# Altium footprint library Embedded_Modules.PcbLib: 15 footprints
Each footprint in its own frame and in the unit in brackets; x right, y up, seen from the top. Pads: shape width x height; smd on the part's side, far side on the other; paste and mask are expansions set on the pad; w line width, h text height; cw(c..) or ccw(c..) is an arc to the next point about the centre after c.
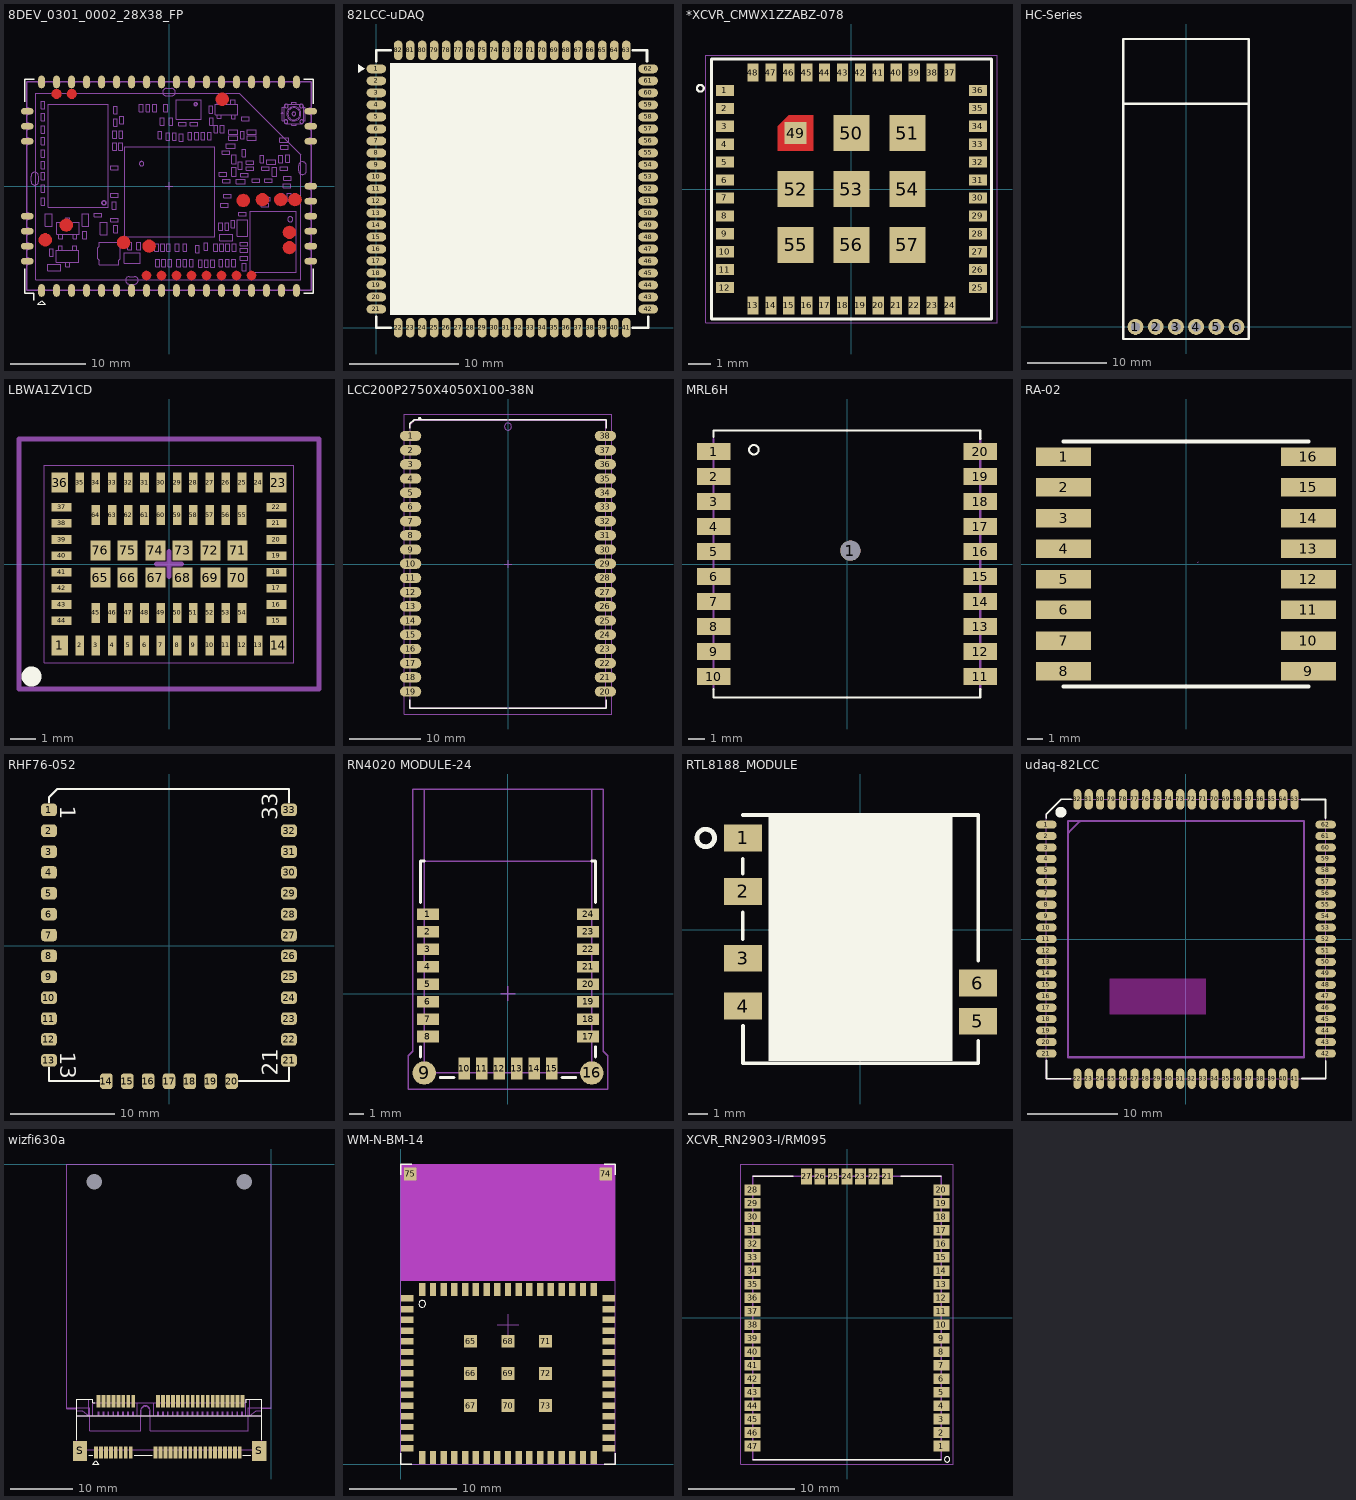
[diagram p0: the footprints below, top view; thin cyan lines are the x and y axes]

## 8DEV_0301_0002_28X38_FP [mm]
height 1.2
pads (52):
  oval 0.898x1.698 smd mask+0.1: 1(-16.998,-13.898) 2(-14.998,-13.898) 3(-12.998,-13.898) 4(-10.999,-13.898) 5(-8.998,-13.898) 6(-6.998,-13.898) 7(-4.998,-13.898) 8(-2.998,-13.898) 9(-0.998,-13.898) 10(0.998,-13.898) 11(2.998,-13.898) 12(4.998,-13.898) 13(6.998,-13.898) 14(8.998,-13.898) 15(10.998,-13.898) 16(12.998,-13.898) 17(14.998,-13.898) 18(16.998,-13.898) 28(16.998,13.898) 29(14.998,13.898) 30(12.998,13.898) 31(10.998,13.898) 32(8.998,13.898) 33(6.998,13.898) 34(4.998,13.898) 35(2.998,13.898) 36(0.998,13.898) 37(-0.998,13.898) 38(-2.998,13.898) 39(-4.998,13.898) 40(-6.998,13.898) 41(-8.998,13.898) 42(-10.999,13.898) 43(-12.998,13.898) 44(-14.998,13.898) 45(-16.998,13.898)
  oval 1.698x0.898 smd mask+0.1: 19(18.898,-9.998) 20(18.898,-7.998) 21(18.898,-5.998) 22(18.898,-3.998) 23(18.898,-1.998) 24(18.898,0) 25(18.898,5.998) 26(18.898,7.998) 27(18.898,9.998) 46(-18.898,9.998) 47(-18.898,7.998) 48(-18.898,5.998) 49(-18.898,-3.998) 50(-18.898,-5.998) 51(-18.898,-7.998) 52(-18.898,-9.998)
Top Layer:
  pour cut-out: 16.273,-7.357 16.274,-7.358 16.276,-7.358 16.483,-7.444 16.484,-7.445 16.486,-7.446 16.663,-7.582 16.664,-7.584 16.666,-7.585 16.802,-7.762 16.803,-7.764 16.804,-7.765 16.89,-7.972 16.89,-7.974 16.891,-7.975 16.92,-8.197 16.919,-8.199 16.92,-8.201 16.891,-8.423 16.89,-8.424 16.89,-8.426 16.804,-8.633 16.803,-8.634 16.802,-8.636 16.666,-8.813 16.664,-8.814 16.663,-8.816 16.486,-8.952 16.484,-8.953 16.483,-8.954 16.276,-9.04 16.274,-9.04 16.273,-9.041 16.051,-9.07 16.049,-9.069 16.047,-9.07 15.825,-9.041 15.824,-9.04 15.822,-9.04 15.615,-8.954 15.614,-8.953 15.612,-8.952 15.435,-8.816 15.434,-8.814 15.432,-8.813 15.296,-8.636 15.295,-8.634 15.294,-8.633 15.208,-8.426 15.208,-8.424 15.207,-8.423 15.178,-8.201 15.178,-8.2 15.178,-8.199 15.18,-8.195 15.181,-8.191 15.182,-8.19 15.182,-8.189 15.182,-8.188 15.18,-8.184 15.18,-8.183 15.18,-8.182 15.207,-7.975 15.208,-7.974 15.208,-7.972 15.294,-7.765 15.295,-7.764 15.296,-7.762 15.432,-7.585 15.434,-7.584 15.435,-7.582 15.612,-7.446 15.614,-7.445 15.615,-7.444 15.822,-7.358 15.824,-7.358 15.825,-7.357 16.047,-7.328 16.049,-7.329 16.051,-7.328
  pour cut-out: -13.475,-4.357 -13.474,-4.358 -13.472,-4.358 -13.265,-4.444 -13.264,-4.445 -13.262,-4.446 -13.085,-4.582 -13.084,-4.584 -13.082,-4.585 -12.946,-4.762 -12.945,-4.764 -12.944,-4.765 -12.858,-4.972 -12.858,-4.974 -12.857,-4.975 -12.828,-5.197 -12.829,-5.199 -12.828,-5.201 -12.857,-5.423 -12.858,-5.424 -12.858,-5.426 -12.944,-5.633 -12.945,-5.634 -12.946,-5.636 -13.082,-5.813 -13.084,-5.814 -13.085,-5.816 -13.262,-5.952 -13.264,-5.953 -13.265,-5.954 -13.472,-6.04 -13.474,-6.04 -13.475,-6.041 -13.697,-6.07 -13.699,-6.069 -13.701,-6.07 -13.923,-6.041 -13.924,-6.04 -13.926,-6.04 -14.133,-5.954 -14.134,-5.953 -14.136,-5.952 -14.313,-5.816 -14.314,-5.814 -14.316,-5.813 -14.452,-5.636 -14.453,-5.634 -14.454,-5.633 -14.54,-5.426 -14.54,-5.424 -14.541,-5.423 -14.57,-5.201 -14.57,-5.2 -14.57,-5.199 -14.568,-5.195 -14.567,-5.191 -14.566,-5.19 -14.566,-5.189 -14.566,-5.188 -14.568,-5.184 -14.568,-5.183 -14.568,-5.182 -14.541,-4.975 -14.54,-4.974 -14.54,-4.972 -14.454,-4.765 -14.453,-4.764 -14.452,-4.762 -14.316,-4.585 -14.314,-4.584 -14.313,-4.582 -14.136,-4.446 -14.134,-4.445 -14.133,-4.444 -13.926,-4.358 -13.924,-4.358 -13.923,-4.357 -13.701,-4.328 -13.699,-4.329 -13.697,-4.328
  pour cut-out: -5.825,-6.657 -5.824,-6.658 -5.822,-6.658 -5.615,-6.744 -5.614,-6.745 -5.612,-6.746 -5.435,-6.882 -5.434,-6.884 -5.432,-6.885 -5.296,-7.062 -5.295,-7.064 -5.294,-7.065 -5.208,-7.272 -5.208,-7.274 -5.207,-7.275 -5.178,-7.497 -5.179,-7.499 -5.178,-7.501 -5.207,-7.723 -5.208,-7.724 -5.208,-7.726 -5.294,-7.933 -5.295,-7.934 -5.296,-7.936 -5.432,-8.113 -5.434,-8.114 -5.435,-8.116 -5.612,-8.252 -5.614,-8.253 -5.615,-8.254 -5.822,-8.34 -5.824,-8.34 -5.825,-8.341 -6.047,-8.37 -6.049,-8.369 -6.051,-8.37 -6.273,-8.341 -6.274,-8.34 -6.276,-8.34 -6.483,-8.254 -6.484,-8.253 -6.486,-8.252 -6.663,-8.116 -6.664,-8.114 -6.666,-8.113 -6.802,-7.936 -6.803,-7.934 -6.804,-7.933 -6.89,-7.726 -6.89,-7.724 -6.891,-7.723 -6.92,-7.501 -6.92,-7.5 -6.92,-7.499 -6.918,-7.495 -6.917,-7.491 -6.916,-7.49 -6.916,-7.489 -6.916,-7.488 -6.918,-7.484 -6.918,-7.483 -6.918,-7.482 -6.891,-7.275 -6.89,-7.274 -6.89,-7.272 -6.804,-7.065 -6.803,-7.064 -6.802,-7.062 -6.666,-6.885 -6.664,-6.884 -6.663,-6.882 -6.486,-6.746 -6.484,-6.745 -6.483,-6.744 -6.276,-6.658 -6.274,-6.658 -6.273,-6.657 -6.051,-6.628 -6.049,-6.629 -6.047,-6.628
  pour cut-out: -2.425,-7.157 -2.424,-7.158 -2.422,-7.158 -2.215,-7.244 -2.214,-7.245 -2.212,-7.246 -2.035,-7.382 -2.034,-7.384 -2.032,-7.385 -1.896,-7.562 -1.895,-7.564 -1.894,-7.565 -1.808,-7.772 -1.808,-7.774 -1.807,-7.775 -1.778,-7.997 -1.779,-7.999 -1.778,-8.001 -1.807,-8.223 -1.808,-8.224 -1.808,-8.226 -1.894,-8.433 -1.895,-8.434 -1.896,-8.436 -2.032,-8.613 -2.034,-8.614 -2.035,-8.616 -2.212,-8.752 -2.214,-8.753 -2.215,-8.754 -2.422,-8.84 -2.424,-8.84 -2.425,-8.841 -2.647,-8.87 -2.649,-8.869 -2.651,-8.87 -2.873,-8.841 -2.874,-8.84 -2.876,-8.84 -3.083,-8.754 -3.084,-8.753 -3.086,-8.752 -3.263,-8.616 -3.264,-8.614 -3.266,-8.613 -3.402,-8.436 -3.403,-8.434 -3.404,-8.433 -3.49,-8.226 -3.49,-8.224 -3.491,-8.223 -3.52,-8.001 -3.52,-8 -3.52,-7.999 -3.518,-7.995 -3.517,-7.991 -3.516,-7.99 -3.516,-7.989 -3.516,-7.988 -3.518,-7.984 -3.518,-7.983 -3.518,-7.982 -3.491,-7.775 -3.49,-7.774 -3.49,-7.772 -3.404,-7.565 -3.403,-7.564 -3.402,-7.562 -3.266,-7.385 -3.264,-7.384 -3.263,-7.382 -3.086,-7.246 -3.084,-7.245 -3.083,-7.244 -2.876,-7.158 -2.874,-7.158 -2.873,-7.157 -2.651,-7.128 -2.649,-7.129 -2.647,-7.128
  pour cut-out: -2.759,-11.313 -2.757,-11.314 -2.754,-11.315 -2.553,-11.449 -2.551,-11.451 -2.549,-11.453 -2.415,-11.654 -2.414,-11.657 -2.413,-11.659 -2.366,-11.896 -2.366,-11.899 -2.366,-11.902 -2.413,-12.139 -2.414,-12.141 -2.415,-12.144 -2.549,-12.345 -2.551,-12.347 -2.553,-12.349 -2.754,-12.483 -2.757,-12.484 -2.759,-12.485 -2.996,-12.532 -2.999,-12.532 -3.002,-12.532 -3.239,-12.485 -3.241,-12.484 -3.244,-12.483 -3.445,-12.349 -3.447,-12.347 -3.449,-12.345 -3.583,-12.144 -3.584,-12.141 -3.585,-12.139 -3.632,-11.902 -3.632,-11.899 -3.632,-11.896 -3.585,-11.659 -3.584,-11.657 -3.583,-11.654 -3.449,-11.453 -3.447,-11.451 -3.445,-11.449 -3.244,-11.315 -3.241,-11.314 -3.239,-11.313 -3.102,-11.285 -3.101,-11.285 -3.101,-11.286 -3.093,-11.284 -3.091,-11.283 -3.002,-11.266 -2.999,-11.266 -2.996,-11.266
  pour cut-out: 7.323,12.441 7.324,12.44 7.326,12.44 7.533,12.354 7.534,12.353 7.536,12.352 7.713,12.216 7.714,12.214 7.716,12.213 7.852,12.036 7.853,12.034 7.854,12.033 7.94,11.826 7.94,11.824 7.941,11.823 7.97,11.601 7.969,11.599 7.97,11.597 7.941,11.375 7.94,11.374 7.94,11.372 7.854,11.165 7.853,11.164 7.852,11.162 7.716,10.985 7.714,10.984 7.713,10.982 7.536,10.846 7.534,10.845 7.533,10.844 7.326,10.758 7.324,10.758 7.323,10.757 7.101,10.728 7.099,10.729 7.097,10.728 6.875,10.757 6.874,10.758 6.872,10.758 6.665,10.844 6.664,10.845 6.662,10.846 6.485,10.982 6.484,10.984 6.482,10.985 6.346,11.162 6.345,11.164 6.344,11.165 6.258,11.372 6.258,11.374 6.257,11.375 6.228,11.597 6.228,11.598 6.228,11.599 6.23,11.603 6.231,11.607 6.232,11.608 6.232,11.609 6.232,11.61 6.23,11.614 6.23,11.615 6.23,11.616 6.257,11.823 6.258,11.824 6.258,11.826 6.344,12.033 6.345,12.034 6.346,12.036 6.482,12.213 6.484,12.214 6.485,12.216 6.662,12.352 6.664,12.353 6.665,12.354 6.872,12.44 6.874,12.44 6.875,12.441 7.097,12.47 7.099,12.469 7.101,12.47
  pour cut-out: -0.759,-11.313 -0.757,-11.314 -0.754,-11.315 -0.553,-11.449 -0.551,-11.451 -0.549,-11.453 -0.415,-11.654 -0.414,-11.657 -0.413,-11.659 -0.366,-11.896 -0.366,-11.899 -0.366,-11.902 -0.413,-12.139 -0.414,-12.141 -0.415,-12.144 -0.549,-12.345 -0.551,-12.347 -0.553,-12.349 -0.754,-12.483 -0.757,-12.484 -0.759,-12.485 -0.996,-12.532 -0.999,-12.532 -1.002,-12.532 -1.239,-12.485 -1.241,-12.484 -1.244,-12.483 -1.445,-12.349 -1.447,-12.347 -1.449,-12.345 -1.583,-12.144 -1.584,-12.141 -1.585,-12.139 -1.632,-11.902 -1.632,-11.899 -1.632,-11.896 -1.585,-11.659 -1.584,-11.657 -1.583,-11.654 -1.449,-11.453 -1.447,-11.451 -1.445,-11.449 -1.244,-11.315 -1.241,-11.314 -1.239,-11.313 -1.102,-11.285 -1.101,-11.285 -1.101,-11.286 -1.093,-11.284 -1.091,-11.283 -1.002,-11.266 -0.999,-11.266 -0.996,-11.266
  pour cut-out: 1.239,-11.313 1.241,-11.314 1.244,-11.315 1.445,-11.449 1.447,-11.451 1.449,-11.453 1.583,-11.654 1.584,-11.657 1.585,-11.659 1.632,-11.896 1.632,-11.899 1.632,-11.902 1.585,-12.139 1.584,-12.141 1.583,-12.144 1.449,-12.345 1.447,-12.347 1.445,-12.349 1.244,-12.483 1.241,-12.484 1.239,-12.485 1.002,-12.532 0.999,-12.532 0.996,-12.532 0.759,-12.485 0.757,-12.484 0.754,-12.483 0.553,-12.349 0.551,-12.347 0.549,-12.345 0.415,-12.144 0.414,-12.141 0.413,-12.139 0.366,-11.902 0.366,-11.899 0.366,-11.896 0.413,-11.659 0.414,-11.657 0.415,-11.654 0.549,-11.453 0.551,-11.451 0.553,-11.449 0.754,-11.315 0.757,-11.314 0.759,-11.313 0.896,-11.285 0.897,-11.285 0.897,-11.286 0.905,-11.284 0.907,-11.283 0.996,-11.266 0.999,-11.266 1.002,-11.266
  pour cut-out: 3.239,-11.313 3.241,-11.314 3.244,-11.315 3.445,-11.449 3.447,-11.451 3.449,-11.453 3.583,-11.654 3.584,-11.657 3.585,-11.659 3.632,-11.896 3.632,-11.899 3.632,-11.902 3.585,-12.139 3.584,-12.141 3.583,-12.144 3.449,-12.345 3.447,-12.347 3.445,-12.349 3.244,-12.483 3.241,-12.484 3.239,-12.485 3.002,-12.532 2.999,-12.532 2.996,-12.532 2.759,-12.485 2.757,-12.484 2.754,-12.483 2.553,-12.349 2.551,-12.347 2.549,-12.345 2.415,-12.144 2.414,-12.141 2.413,-12.139 2.366,-11.902 2.366,-11.899 2.366,-11.896 2.413,-11.659 2.414,-11.657 2.415,-11.654 2.549,-11.453 2.551,-11.451 2.553,-11.449 2.754,-11.315 2.757,-11.314 2.759,-11.313 2.896,-11.285 2.897,-11.285 2.897,-11.286 2.905,-11.284 2.907,-11.283 2.996,-11.266 2.999,-11.266 3.002,-11.266
  pour cut-out: -12.7,12.909 -12.698,12.908 -12.695,12.907 -12.486,12.768 -12.484,12.766 -12.482,12.764 -12.343,12.555 -12.342,12.552 -12.341,12.55 -12.292,12.304 -12.292,12.301 -12.292,12.298 -12.341,12.052 -12.342,12.05 -12.343,12.047 -12.482,11.838 -12.484,11.836 -12.486,11.834 -12.695,11.695 -12.698,11.694 -12.7,11.693 -12.946,11.644 -12.949,11.644 -12.952,11.644 -13.198,11.693 -13.2,11.694 -13.203,11.695 -13.412,11.834 -13.414,11.836 -13.416,11.838 -13.555,12.047 -13.556,12.05 -13.557,12.052 -13.606,12.298 -13.606,12.301 -13.606,12.304 -13.557,12.55 -13.556,12.552 -13.555,12.555 -13.416,12.764 -13.414,12.766 -13.412,12.768 -13.203,12.907 -13.2,12.908 -13.198,12.909 -13.154,12.918 -13.15,12.917 -13.148,12.917 -13.145,12.92 -13.144,12.92 -13.143,12.92 -12.952,12.958 -12.949,12.958 -12.946,12.958
  pour cut-out: -14.75,12.909 -14.748,12.908 -14.745,12.907 -14.536,12.768 -14.534,12.766 -14.532,12.764 -14.393,12.555 -14.392,12.552 -14.391,12.55 -14.342,12.304 -14.342,12.301 -14.342,12.298 -14.391,12.052 -14.392,12.05 -14.393,12.047 -14.532,11.838 -14.534,11.836 -14.536,11.834 -14.745,11.695 -14.748,11.694 -14.75,11.693 -14.996,11.644 -14.999,11.644 -15.002,11.644 -15.248,11.693 -15.25,11.694 -15.253,11.695 -15.462,11.834 -15.464,11.836 -15.466,11.838 -15.605,12.047 -15.606,12.05 -15.607,12.052 -15.656,12.298 -15.656,12.301 -15.656,12.304 -15.607,12.55 -15.606,12.552 -15.605,12.555 -15.466,12.764 -15.464,12.766 -15.462,12.768 -15.253,12.907 -15.25,12.908 -15.248,12.909 -15.204,12.918 -15.2,12.917 -15.198,12.917 -15.195,12.92 -15.194,12.92 -15.193,12.92 -15.002,12.958 -14.999,12.958 -14.996,12.958
  pour cut-out: -16.275,-6.307 -16.274,-6.308 -16.272,-6.308 -16.065,-6.394 -16.064,-6.395 -16.062,-6.396 -15.885,-6.532 -15.884,-6.534 -15.882,-6.535 -15.746,-6.712 -15.745,-6.714 -15.744,-6.715 -15.658,-6.922 -15.658,-6.924 -15.657,-6.925 -15.628,-7.147 -15.629,-7.149 -15.628,-7.151 -15.657,-7.373 -15.658,-7.374 -15.658,-7.376 -15.744,-7.583 -15.745,-7.584 -15.746,-7.586 -15.882,-7.763 -15.884,-7.764 -15.885,-7.766 -16.062,-7.902 -16.064,-7.903 -16.065,-7.904 -16.272,-7.99 -16.274,-7.99 -16.275,-7.991 -16.497,-8.02 -16.499,-8.019 -16.501,-8.02 -16.723,-7.991 -16.724,-7.99 -16.726,-7.99 -16.933,-7.904 -16.934,-7.903 -16.936,-7.902 -17.113,-7.766 -17.114,-7.764 -17.116,-7.763 -17.252,-7.586 -17.253,-7.584 -17.254,-7.583 -17.34,-7.376 -17.34,-7.374 -17.341,-7.373 -17.37,-7.151 -17.37,-7.15 -17.37,-7.149 -17.368,-7.145 -17.367,-7.141 -17.366,-7.14 -17.366,-7.139 -17.366,-7.138 -17.368,-7.134 -17.368,-7.133 -17.368,-7.132 -17.341,-6.925 -17.34,-6.924 -17.34,-6.922 -17.254,-6.715 -17.253,-6.714 -17.252,-6.712 -17.116,-6.535 -17.114,-6.534 -17.113,-6.532 -16.936,-6.396 -16.934,-6.395 -16.933,-6.394 -16.726,-6.308 -16.724,-6.308 -16.723,-6.307 -16.501,-6.278 -16.499,-6.279 -16.497,-6.278
  pour cut-out: 5.239,-11.313 5.241,-11.314 5.244,-11.315 5.445,-11.449 5.447,-11.451 5.449,-11.453 5.583,-11.654 5.584,-11.657 5.585,-11.659 5.632,-11.896 5.632,-11.899 5.632,-11.902 5.585,-12.139 5.584,-12.141 5.583,-12.144 5.449,-12.345 5.447,-12.347 5.445,-12.349 5.244,-12.483 5.241,-12.484 5.239,-12.485 5.002,-12.532 4.999,-12.532 4.996,-12.532 4.759,-12.485 4.757,-12.484 4.754,-12.483 4.553,-12.349 4.551,-12.347 4.549,-12.345 4.415,-12.144 4.414,-12.141 4.413,-12.139 4.366,-11.902 4.366,-11.899 4.366,-11.896 4.413,-11.659 4.414,-11.657 4.415,-11.654 4.549,-11.453 4.551,-11.451 4.553,-11.449 4.754,-11.315 4.757,-11.314 4.759,-11.313 4.896,-11.285 4.897,-11.285 4.897,-11.286 4.905,-11.284 4.907,-11.283 4.996,-11.266 4.999,-11.266 5.002,-11.266
  pour cut-out: 7.239,-11.313 7.241,-11.314 7.244,-11.315 7.445,-11.449 7.447,-11.451 7.449,-11.453 7.583,-11.654 7.584,-11.657 7.585,-11.659 7.632,-11.896 7.632,-11.899 7.632,-11.902 7.585,-12.139 7.584,-12.141 7.583,-12.144 7.449,-12.345 7.447,-12.347 7.445,-12.349 7.244,-12.483 7.241,-12.484 7.239,-12.485 7.002,-12.532 6.999,-12.532 6.996,-12.532 6.759,-12.485 6.757,-12.484 6.754,-12.483 6.553,-12.349 6.551,-12.347 6.549,-12.345 6.415,-12.144 6.414,-12.141 6.413,-12.139 6.366,-11.902 6.366,-11.899 6.366,-11.896 6.413,-11.659 6.414,-11.657 6.415,-11.654 6.549,-11.453 6.551,-11.451 6.553,-11.449 6.754,-11.315 6.757,-11.314 6.759,-11.313 6.896,-11.285 6.897,-11.285 6.897,-11.286 6.905,-11.284 6.907,-11.283 6.996,-11.266 6.999,-11.266 7.002,-11.266
  pour cut-out: 9.239,-11.313 9.241,-11.314 9.244,-11.315 9.445,-11.449 9.447,-11.451 9.449,-11.453 9.583,-11.654 9.584,-11.657 9.585,-11.659 9.632,-11.896 9.632,-11.899 9.632,-11.902 9.585,-12.139 9.584,-12.141 9.583,-12.144 9.449,-12.345 9.447,-12.347 9.445,-12.349 9.244,-12.483 9.241,-12.484 9.239,-12.485 9.002,-12.532 8.999,-12.532 8.996,-12.532 8.759,-12.485 8.757,-12.484 8.754,-12.483 8.553,-12.349 8.551,-12.347 8.549,-12.345 8.415,-12.144 8.414,-12.141 8.413,-12.139 8.366,-11.902 8.366,-11.899 8.366,-11.896 8.413,-11.659 8.414,-11.657 8.415,-11.654 8.549,-11.453 8.551,-11.451 8.553,-11.449 8.754,-11.315 8.757,-11.314 8.759,-11.313 8.896,-11.285 8.897,-11.285 8.897,-11.286 8.905,-11.284 8.907,-11.283 8.996,-11.266 8.999,-11.266 9.002,-11.266
  pour cut-out: 11.239,-11.313 11.241,-11.314 11.244,-11.315 11.445,-11.449 11.447,-11.451 11.449,-11.453 11.583,-11.654 11.584,-11.657 11.585,-11.659 11.632,-11.896 11.632,-11.899 11.632,-11.902 11.585,-12.139 11.584,-12.141 11.583,-12.144 11.449,-12.345 11.447,-12.347 11.445,-12.349 11.244,-12.483 11.241,-12.484 11.239,-12.485 11.002,-12.532 10.999,-12.532 10.996,-12.532 10.759,-12.485 10.757,-12.484 10.754,-12.483 10.553,-12.349 10.551,-12.347 10.549,-12.345 10.415,-12.144 10.414,-12.141 10.413,-12.139 10.366,-11.902 10.366,-11.899 10.366,-11.896 10.413,-11.659 10.414,-11.657 10.415,-11.654 10.549,-11.453 10.551,-11.451 10.553,-11.449 10.754,-11.315 10.757,-11.314 10.759,-11.313 10.896,-11.285 10.897,-11.285 10.897,-11.286 10.905,-11.284 10.907,-11.283 10.996,-11.266 10.999,-11.266 11.002,-11.266
  pour cut-out: 10.123,-1.057 10.124,-1.058 10.126,-1.058 10.333,-1.144 10.334,-1.145 10.336,-1.146 10.513,-1.282 10.514,-1.284 10.516,-1.285 10.652,-1.462 10.653,-1.464 10.654,-1.465 10.74,-1.672 10.74,-1.674 10.741,-1.675 10.77,-1.897 10.769,-1.899 10.77,-1.901 10.741,-2.123 10.74,-2.124 10.74,-2.126 10.654,-2.333 10.653,-2.334 10.652,-2.336 10.516,-2.513 10.514,-2.514 10.513,-2.516 10.336,-2.652 10.334,-2.653 10.333,-2.654 10.126,-2.74 10.124,-2.74 10.123,-2.741 9.901,-2.77 9.899,-2.769 9.897,-2.77 9.675,-2.741 9.674,-2.74 9.672,-2.74 9.465,-2.654 9.464,-2.653 9.462,-2.652 9.285,-2.516 9.284,-2.514 9.282,-2.513 9.146,-2.336 9.145,-2.334 9.144,-2.333 9.058,-2.126 9.058,-2.124 9.057,-2.123 9.028,-1.901 9.028,-1.9 9.028,-1.899 9.03,-1.895 9.031,-1.891 9.032,-1.89 9.032,-1.889 9.032,-1.888 9.03,-1.884 9.03,-1.883 9.03,-1.882 9.057,-1.675 9.058,-1.674 9.058,-1.672 9.144,-1.465 9.145,-1.464 9.146,-1.462 9.282,-1.285 9.284,-1.284 9.285,-1.282 9.462,-1.146 9.464,-1.145 9.465,-1.144 9.672,-1.058 9.674,-1.058 9.675,-1.057 9.897,-1.028 9.899,-1.029 9.901,-1.028
  pour cut-out: 12.673,-0.957 12.674,-0.958 12.676,-0.958 12.883,-1.044 12.884,-1.045 12.886,-1.046 13.063,-1.182 13.064,-1.184 13.066,-1.185 13.202,-1.362 13.203,-1.364 13.204,-1.365 13.29,-1.572 13.29,-1.574 13.291,-1.575 13.32,-1.797 13.319,-1.799 13.32,-1.801 13.291,-2.023 13.29,-2.024 13.29,-2.026 13.204,-2.233 13.203,-2.234 13.202,-2.236 13.066,-2.413 13.064,-2.414 13.063,-2.416 12.886,-2.552 12.884,-2.553 12.883,-2.554 12.676,-2.64 12.674,-2.64 12.673,-2.641 12.451,-2.67 12.449,-2.669 12.447,-2.67 12.225,-2.641 12.224,-2.64 12.222,-2.64 12.015,-2.554 12.014,-2.553 12.012,-2.552 11.835,-2.416 11.834,-2.414 11.832,-2.413 11.696,-2.236 11.695,-2.234 11.694,-2.233 11.608,-2.026 11.608,-2.024 11.607,-2.023 11.578,-1.801 11.578,-1.8 11.578,-1.799 11.58,-1.795 11.581,-1.791 11.582,-1.79 11.582,-1.789 11.582,-1.788 11.58,-1.784 11.58,-1.783 11.58,-1.782 11.607,-1.575 11.608,-1.574 11.608,-1.572 11.694,-1.365 11.695,-1.364 11.696,-1.362 11.832,-1.185 11.834,-1.184 11.835,-1.182 12.012,-1.046 12.014,-1.045 12.015,-1.044 12.222,-0.958 12.224,-0.958 12.225,-0.957 12.447,-0.928 12.449,-0.929 12.451,-0.928
  pour cut-out: 15.123,-0.957 15.124,-0.958 15.126,-0.958 15.333,-1.044 15.334,-1.045 15.336,-1.046 15.513,-1.182 15.514,-1.184 15.516,-1.185 15.652,-1.362 15.653,-1.364 15.654,-1.365 15.74,-1.572 15.74,-1.574 15.741,-1.575 15.77,-1.797 15.769,-1.799 15.77,-1.801 15.741,-2.023 15.74,-2.024 15.74,-2.026 15.654,-2.233 15.653,-2.234 15.652,-2.236 15.516,-2.413 15.514,-2.414 15.513,-2.416 15.336,-2.552 15.334,-2.553 15.333,-2.554 15.126,-2.64 15.124,-2.64 15.123,-2.641 14.901,-2.67 14.899,-2.669 14.897,-2.67 14.675,-2.641 14.674,-2.64 14.672,-2.64 14.465,-2.554 14.464,-2.553 14.462,-2.552 14.285,-2.416 14.284,-2.414 14.282,-2.413 14.146,-2.236 14.145,-2.234 14.144,-2.233 14.058,-2.026 14.058,-2.024 14.057,-2.023 14.028,-1.801 14.028,-1.8 14.028,-1.799 14.03,-1.795 14.031,-1.791 14.032,-1.79 14.032,-1.789 14.032,-1.788 14.03,-1.784 14.03,-1.783 14.03,-1.782 14.057,-1.575 14.058,-1.574 14.058,-1.572 14.144,-1.365 14.145,-1.364 14.146,-1.362 14.282,-1.185 14.284,-1.184 14.285,-1.182 14.462,-1.046 14.464,-1.045 14.465,-1.044 14.672,-0.958 14.674,-0.958 14.675,-0.957 14.897,-0.928 14.899,-0.929 14.901,-0.928
  pour cut-out: 17.023,-0.957 17.024,-0.958 17.026,-0.958 17.233,-1.044 17.234,-1.045 17.236,-1.046 17.413,-1.182 17.414,-1.184 17.416,-1.185 17.552,-1.362 17.553,-1.364 17.554,-1.365 17.64,-1.572 17.64,-1.574 17.641,-1.575 17.67,-1.797 17.669,-1.799 17.67,-1.801 17.641,-2.023 17.64,-2.024 17.64,-2.026 17.554,-2.233 17.553,-2.234 17.552,-2.236 17.416,-2.413 17.414,-2.414 17.413,-2.416 17.236,-2.552 17.234,-2.553 17.233,-2.554 17.026,-2.64 17.024,-2.64 17.023,-2.641 16.801,-2.67 16.799,-2.669 16.797,-2.67 16.575,-2.641 16.574,-2.64 16.572,-2.64 16.365,-2.554 16.364,-2.553 16.362,-2.552 16.185,-2.416 16.184,-2.414 16.182,-2.413 16.046,-2.236 16.045,-2.234 16.044,-2.233 15.958,-2.026 15.958,-2.024 15.957,-2.023 15.928,-1.801 15.928,-1.8 15.928,-1.799 15.93,-1.795 15.931,-1.791 15.932,-1.79 15.932,-1.789 15.932,-1.788 15.93,-1.784 15.93,-1.783 15.93,-1.782 15.957,-1.575 15.958,-1.574 15.958,-1.572 16.044,-1.365 16.045,-1.364 16.046,-1.362 16.182,-1.185 16.184,-1.184 16.185,-1.182 16.362,-1.046 16.364,-1.045 16.365,-1.044 16.572,-0.958 16.574,-0.958 16.575,-0.957 16.797,-0.928 16.799,-0.929 16.801,-0.928
  pour cut-out: 16.273,-5.308 16.274,-5.309 16.276,-5.309 16.483,-5.395 16.484,-5.396 16.486,-5.397 16.663,-5.533 16.664,-5.535 16.666,-5.536 16.802,-5.713 16.803,-5.715 16.804,-5.716 16.89,-5.923 16.89,-5.925 16.891,-5.926 16.92,-6.148 16.919,-6.15 16.92,-6.152 16.891,-6.374 16.89,-6.375 16.89,-6.377 16.804,-6.584 16.803,-6.585 16.802,-6.587 16.666,-6.764 16.664,-6.765 16.663,-6.767 16.486,-6.903 16.484,-6.904 16.483,-6.905 16.276,-6.991 16.274,-6.991 16.273,-6.992 16.051,-7.021 16.049,-7.02 16.047,-7.021 15.825,-6.992 15.824,-6.991 15.822,-6.991 15.615,-6.905 15.614,-6.904 15.612,-6.903 15.435,-6.767 15.434,-6.765 15.432,-6.764 15.296,-6.587 15.295,-6.585 15.294,-6.584 15.208,-6.377 15.208,-6.375 15.207,-6.374 15.178,-6.152 15.178,-6.151 15.178,-6.15 15.18,-6.146 15.181,-6.142 15.182,-6.141 15.182,-6.14 15.182,-6.139 15.18,-6.135 15.18,-6.134 15.18,-6.133 15.207,-5.926 15.208,-5.925 15.208,-5.923 15.294,-5.716 15.295,-5.715 15.296,-5.713 15.432,-5.536 15.434,-5.535 15.435,-5.533 15.612,-5.397 15.614,-5.396 15.615,-5.395 15.822,-5.309 15.824,-5.309 15.825,-5.308 16.047,-5.279 16.049,-5.28 16.051,-5.279
Top Overlay:
  lines w0.15: -17.5,-15.75 -17,-15.25 -16.5,-15.75 -17.5,-15.75
  lines w0.199: -19.249,-10.999 -19.249,-14.25 -18.049,-14.25 -18.049,-15.199 ; -19.249,11.249 -19.249,14.249 -17.999,14.249 ; 17.949,14.249 19.249,14.249 19.249,10.999 ; 17.999,-14.25 19.249,-14.25 19.249,-10.999
Top Paste:
  drawing of 52 lines, arcs and shapes, not listed
Mechanical 1:
  drawing of 827 lines, arcs and shapes, not listed
  text "46" at -18.734,10.591 h0.52
  text "27" at 17.938,10.491 h0.52
  text "45" at -18.484,12.841 h0.52
  text "19" at 17.617,-11.461 h0.52
  text "1" at -18.119,-13.591 h0.52
  text "18" at 17.478,-13.496 h0.52
  text "28" at 17.118,12.306 h0.52
  text ".Pattern" at -6.971,-15.68 h0.37
  text "52" at -18.684,-11.356 h0.52
Mechanical 16:
  lines w0.025: -0.498,0 0.498,0 ; 0,-0.498 0,0.498
3D body: height 1, standoff 0, extent -18.949,-13.899 18.949,13.899
3D body: height 2, standoff 1, extent -17.799,-12.499 17.599,12.399
3D body: height 1.5, standoff 1, extent 15.35,8.35 17.948,10.948

## 82LCC-uDAQ [mm] "82-LCC - 24.7x25.3mm"
pads (82):
  oval 1.8x0.8 smd: 1(0,23.7) 2(0,22.6) 3(0,21.5) 4(0,20.4) 5(0,19.3) 6(0,18.2) 7(0,17.1) 8(0,16) 9(0,14.9) 10(0,13.8) 11(0,12.7) 12(0,11.6) 13(0,10.5) 14(0,9.4) 15(0,8.3) 16(0,7.2) 17(0,6.1) 18(0,5) 19(0,3.9) 20(0,2.8) 21(0,1.7) 42(24.9,1.7) 43(24.9,2.8) 44(24.9,3.9) 45(24.9,5) 46(24.9,6.1) 47(24.9,7.2) 48(24.9,8.3) 49(24.9,9.4) 50(24.9,10.5) 51(24.9,11.6) 52(24.9,12.7) 53(24.9,13.8) 54(24.9,14.9) 55(24.9,16) 56(24.9,17.1) 57(24.9,18.2) 58(24.9,19.3) 59(24.9,20.4) 60(24.9,21.5) 61(24.9,22.6) 62(24.9,23.7)
  oval 0.8x1.8 smd: 22(2,0) 23(3.1,0) 24(4.2,0) 25(5.3,0) 26(6.4,0) 27(7.5,0) 28(8.6,0) 29(9.7,0) 30(10.8,0) 31(11.9,0) 32(13,0) 33(14.1,0) 34(15.2,0) 35(16.3,0) 36(17.4,0) 37(18.5,0) 38(19.6,0) 39(20.7,0) 40(21.8,0) 41(22.9,0) 63(22.9,25.4) 64(21.8,25.4) 65(20.7,25.4) 66(19.6,25.4) 67(18.5,25.4) 68(17.4,25.4) 69(16.3,25.4) 70(15.2,25.4) 71(14.1,25.4) 72(13,25.4) 73(11.9,25.4) 74(10.8,25.4) 75(9.7,25.4) 76(8.6,25.4) 77(7.5,25.4) 78(6.4,25.4) 79(5.3,25.4) 80(4.2,25.4) 81(3.1,25.4) 82(2,25.4)
Top Overlay:
  rectangle: 1.25,1.15 23.775,24.225
  region: -1.075,23.725 -1.675,24.125 -1.675,23.325
  lines w0.254: 0,1 0,0 1.3,0 ; 0,24.4 0,25.4 1.3,25.4 ; 23.5,0 24.9,0 24.9,1 ; 23.5,25.4 24.8,25.4 24.8,24.4
3D body "uDAQ.step": height 2.92, standoff 0.01, extent -0.05,-0.05 24.852,25.35

## *XCVR_CMWX1ZZABZ-078 [mm]
pads (57):
  rect 0.8x0.5 smd: 1(-5.65,4.4) 2(-5.65,3.6) 3(-5.65,2.8) 4(-5.65,2) 5(-5.65,1.2) 6(-5.65,0.4) 7(-5.65,-0.4) 8(-5.65,-1.2) 9(-5.65,-2) 10(-5.65,-2.8) 11(-5.65,-3.6) 12(-5.65,-4.4) 25(5.65,-4.4) 26(5.65,-3.6) 27(5.65,-2.8) 28(5.65,-2) 29(5.65,-1.2) 30(5.65,-0.4) 31(5.65,0.4) 32(5.65,1.2) 33(5.65,2) 34(5.65,2.8) 35(5.65,3.6) 36(5.65,4.4)
  rect 0.5x0.8 smd: 13(-4.4,-5.2) 14(-3.6,-5.2) 15(-2.8,-5.2) 16(-2,-5.2) 17(-1.2,-5.2) 18(-0.4,-5.2) 19(0.4,-5.2) 20(1.2,-5.2) 21(2,-5.2) 22(2.8,-5.2) 23(3.6,-5.2) 24(4.4,-5.2) 37(4.4,5.2) 38(3.6,5.2) 39(2.8,5.2) 40(2,5.2) 41(1.2,5.2) 42(0.4,5.2) 43(-0.4,5.2) 44(-1.2,5.2) 45(-2,5.2) 46(-2.8,5.2) 47(-3.6,5.2) 48(-4.4,5.2)
  rect 1x1 smd: 49(-2.5,2.5)
  rect 1.6x1.6 smd: 50(0,2.5) 51(2.5,2.5) 52(-2.5,0) 53(0,0) 54(2.5,0) 55(-2.5,-2.5) 56(0,-2.5) 57(2.5,-2.5)
Top Layer:
  region: -1.225,1.65 -0.975,1.65 0.975,1.65 1.225,1.65
  region: -1.7,1.7 -1.7,3.3 -2.8,3.3 -3.3,2.8 -3.3,1.7
Top Overlay:
  circle w0.1: c-6.75,4.5 r0.15
  lines w0.127: -6.25,-5.8 -6.25,5.8 6.25,5.8 6.25,-5.8 -6.25,-5.8
Top Paste:
  region: -1.7,1.7 -1.7,3.3 -2.8,3.3 -3.3,2.8 -3.3,1.7
Top Solder:
  region: -1.225,1.65 -0.975,1.65 0.975,1.65 1.225,1.65
  region: -3.4,1.6 -1.6,1.6 -1.6,3.4 -2.9,3.4 -3.4,2.9
Mechanical 16:
  lines w0.05: -6.5,-5.975 6.5,-5.975 6.5,5.975 -6.5,5.975 -6.5,-5.975
3D body "CMWX1ZZABZ-078--3DModel-STEP-56544.STEP": height 1.76, standoff 0, extent -6.25,-5.8 6.25,5.8

## HC-Series [mm]
pads (6):
  round 2 hole 1.1: 1(-6.35,0) 2(-3.81,0) 3(-1.27,0) 4(1.27,0) 5(3.81,0) 6(6.35,0)
Top Overlay:
  lines w0.3: -7.874,28.067 7.874,28.067 ; -7.874,-1.524 -7.874,36.195 7.874,36.195 7.874,-1.524 -7.874,-1.524
3D body "HC-SERIES.stp": height 3.91, standoff -7.52, extent -7.977,-1.397 7.723,36.203

## LBWA1ZV1CD [mm]
pads (76):
  rect 0.65x0.8 smd: 1(-4.375,-3.25) 14(4.375,-3.25) 23(4.375,3.25) 36(-4.375,3.25)
  rect 0.35x0.8 smd: 2(-3.575,-3.25) 3(-2.925,-3.25) 4(-2.275,-3.25) 5(-1.625,-3.25) 6(-0.975,-3.25) 7(-0.325,-3.25) 8(0.325,-3.25) 9(0.975,-3.25) 10(1.625,-3.25) 11(2.275,-3.25) 12(2.925,-3.25) 13(3.575,-3.25) 24(3.575,3.25) 25(2.925,3.25) 26(2.275,3.25) 27(1.625,3.25) 28(0.975,3.25) 29(0.325,3.25) 30(-0.325,3.25) 31(-0.975,3.25) 32(-1.625,3.25) 33(-2.275,3.25) 34(-2.925,3.25) 35(-3.575,3.25) 45(-2.925,-1.95) 46(-2.275,-1.95) 47(-1.625,-1.95) 48(-0.975,-1.95) 49(-0.325,-1.95) 50(0.325,-1.95) 51(0.975,-1.95) 52(1.625,-1.95) 53(2.275,-1.95) 54(2.925,-1.95) 55(2.925,1.95) 56(2.275,1.95) 57(1.625,1.95) 58(0.975,1.95) 59(0.325,1.95) 60(-0.325,1.95) 61(-0.975,1.95) 62(-1.625,1.95) 63(-2.275,1.95) 64(-2.925,1.95)
  rect 0.8x0.35 smd: 15(4.3,-2.275) 16(4.3,-1.625) 17(4.3,-0.975) 18(4.3,-0.325) 19(4.3,0.325) 20(4.3,0.975) 21(4.3,1.625) 22(4.3,2.275) 37(-4.3,2.275) 38(-4.3,1.625) 39(-4.3,0.975) 40(-4.3,0.325) 41(-4.3,-0.325) 42(-4.3,-0.975) 43(-4.3,-1.625) 44(-4.3,-2.275)
  rect 0.8x0.8 smd: 65(-2.75,-0.55) 66(-1.65,-0.55) 67(-0.55,-0.55) 68(0.55,-0.55) 69(1.65,-0.55) 70(2.75,-0.55) 71(2.75,0.55) 72(1.65,0.55) 73(0.55,0.55) 74(-0.55,0.55) 75(-1.65,0.55) 76(-2.75,0.55)
Top Overlay:
  circle w0.4: c-5.5,-4.5 r0.2
Mechanical 13:
  lines w0.025: -5,-3.95 5,-3.95 5,3.95 -5,3.95 -5,-3.95
Mechanical 15:
  lines w0.2: -0.5,0 0.5,0 ; 0,-0.5 0,0.5 ; -6,-5 6,-5 6,5 -6,5 -6,-5
3D body: height 1.01, standoff 0.1, extent -5,-3.95 5,3.95
3D body: height 0.1, standoff 0, extent -5.05,-4 5.05,4
3D body: height 1.03, standoff 0.1, extent -4.425,-3.45 -3.725,-2.75

## LCC200P2750X4050X100-38N [mm] "LCC, 38-Pins, Body 27.50x40.50mmx1.00mm, Pitch 2.00mm, IPC Medium Density"
height 1
pads (38):
  oval 3x1.45 smd: 1(-13.716,18.034) 2(-13.716,16.034) 3(-13.716,14.034) 4(-13.716,12.034) 5(-13.716,10.034) 6(-13.716,8.034) 7(-13.716,6.034) 8(-13.716,4.034) 9(-13.716,2.034) 10(-13.716,0.034) 11(-13.716,-1.966) 12(-13.716,-3.966) 13(-13.716,-5.966) 14(-13.716,-7.966) 15(-13.716,-9.966) 16(-13.716,-11.966) 17(-13.716,-13.966) 18(-13.716,-15.966) 19(-13.716,-17.966) 20(13.716,-17.966) 21(13.716,-15.966) 22(13.716,-13.966) 23(13.716,-11.966) 24(13.716,-9.966) 25(13.716,-7.966) 26(13.716,-5.966) 27(13.716,-3.966) 28(13.716,-1.966) 29(13.716,0.034) 30(13.716,2.034) 31(13.716,4.034) 32(13.716,6.034) 33(13.716,8.034) 34(13.716,10.034) 35(13.716,12.034) 36(13.716,14.034) 37(13.716,16.034) 38(13.716,18.034)
Top Overlay:
  circle w0.25: c-12.45,20.475 r0.125
  lines w0.2: -13.85,-19.125 -13.85,-20.35 -0.125,-20.35 ; -13.85,19.125 -13.85,19.737 -13.237,20.35 -0.125,20.35 ; 0.125,-20.35 13.85,-20.35 13.85,-19.125 ; 0.125,20.35 13.85,20.35 13.85,19.125
Mechanical 13:
  circle w0.1: c0,19.35 r0.5
  lines w0.1: -13.75,-20.25 13.75,-20.25 13.75,20.25 -13.137,20.25 -13.75,19.637 -13.75,-20.25
Mechanical 15:
  lines w0.05: -14.625,-21.125 14.625,-21.125 14.625,21.125 -14.625,21.125 -14.625,-21.125
  lines w0.1: -0.5,0 0.5,0 ; 0,-0.5 0,0.5
3D body: height 1, standoff 0, extent -13.75,-20.25 13.75,20.25
3D body "ABM10_Xtal.step": height 1.7, standoff 0.99, extent -4.378,14.952 -1.778,17.052
3D body: height 1.5, standoff 0.1, extent -7.366,-19.05 5.334,-11.43
3D body "SOIC8-1.step": height 2.75, standoff 1, extent 2.884,11.478 7.784,17.478
3D body: height 1.5, standoff 0.1, extent -6.858,-6.858 7.112,7.112
3D body "SOT23-5-2.step": height 2.45, standoff 1, extent 8.964,15.872 11.864,18.672
3D body "SOT23-5-2.step": height 2.45, standoff 1, extent 7.948,-18.164 10.848,-15.364

## MRL6H [mm]
pads (21):
  rect 2x1 smd: 1(-8.001,6.749) 2(-8.001,5.249) 3(-8.001,3.749) 4(-8.001,2.249) 5(-8.001,0.749) 6(-8.001,-0.751) 7(-8.001,-2.251) 8(-8.001,-3.751) 9(-8.001,-5.251) 10(-8.001,-6.751) 11(8.001,-6.751) 12(8.001,-5.251) 13(8.001,-3.751) 14(8.001,-2.251) 15(8.001,-0.751) 16(8.001,0.749) 17(8.001,2.249) 18(8.001,3.749) 19(8.001,5.249) 20(8.001,6.749)
  round 1.2 hole 1.2: 1(0.201,0.801)
Top Overlay:
  circle w0.127: c-5.588,6.858 r0.284
  lines w0.127: -8.001,-7.493 -8.001,-8.001 7.999,-8.001 7.999,-7.493 ; -8.001,7.618 -8.001,8.001 7.999,8.001 7.999,7.491
Mechanical 16:
  lines w0.127: -8.001,-7.493 -8.001,7.491 ; 7.999,-7.493 7.999,7.491
3D body "User Library-gms-g6.step": height 6.8, standoff -0.7, extent -8.001,-7.999 7.999,8.001

## RA-02 [mil]
pads (16):
  rect 141.7x47.2 smd: 1(-315,276) 2(-315,197) 3(-315,118) 4(-315,39) 5(-315,-39) 6(-315,-118) 7(-315,-197) 8(-315,-276) 9(315,-276) 10(315,-197) 11(315,-118) 12(315,-39) 13(315,39) 14(315,118) 15(315,197) 16(315,276)
Top Overlay:
  lines w10: -315.05,-315 314.95,-315 ; -315.05,315 314.95,315
Mechanical 15:
  lines w0.1: 29,4 31,6
3D body "User Library-RA-02.step": height 125.98, standoff 0, extent -314.96,-334.65 314.96,334.65

## RHF76-052 [mm]
height 2.7
pads (33):
  rrect50% 1.5x1.2 smd: 1(-11.5,13) 2(-11.5,11) 3(-11.5,9) 4(-11.5,7) 5(-11.5,5) 6(-11.5,3) 7(-11.5,1) 8(-11.5,-1) 9(-11.5,-3) 10(-11.5,-5) 11(-11.5,-7) 12(-11.5,-9) 13(-11.5,-11) 21(11.5,-11) 22(11.5,-9) 23(11.5,-7) 24(11.5,-5) 25(11.5,-3) 26(11.5,-1) 27(11.5,1) 28(11.5,3) 29(11.5,5) 30(11.5,7) 31(11.5,9) 32(11.5,11) 33(11.5,13)
  rrect50% 1.2x1.5 smd: 14(-6,-13) 15(-4,-13) 16(-2,-13) 17(0,-13) 18(2,-13) 19(4,-13) 20(6,-13)
Top Overlay:
  lines w0.2: -11.5,-11.7 -11.5,-13 -6.7,-13 ; -11.5,13.7 -11.5,14.2 -10.7,15 11.5,15 11.5,13.7 ; 6.7,-13 11.5,-13 11.5,-11.7
  text "33" at 10.4,12 h1.5
  text "21" at 10.4,-12.5 h1.5
  text "13" at -10.4,-10.2 h1.5
  text "1" at -10.4,13.4 h1.5

## RN4020 MODULE-24 [mm]
pads (24):
  rect 1.5x0.8 smd: 1(-5.5,5.45) 2(-5.5,4.25) 3(-5.5,3.05) 4(-5.5,1.85) 5(-5.5,0.65) 6(-5.5,-0.55) 7(-5.5,-1.75) 8(-5.5,-2.95) 17(5.5,-2.95) 18(5.5,-1.75) 19(5.5,-0.55) 20(5.5,0.65) 21(5.5,1.85) 22(5.5,3.05) 23(5.5,4.25) 24(5.5,5.45)
  round 1.6 smd: 9(-5.75,-5.45) 16(5.75,-5.45)
  rect 0.8x1.5 smd: 10(-3,-5.15) 11(-1.8,-5.15) 12(-0.6,-5.15) 13(0.6,-5.15) 14(1.8,-5.15) 15(3,-5.15)
Top Overlay:
  lines w0.2: -6,-4.35 -6,-3.65 ; -6,6.25 -6,9.1 -5.75,9.1 ; -4.65,-5.75 -3.7,-5.75 ; 3.7,-5.75 4.65,-5.75 ; 5.75,9.1 6,9.1 6,6.25 ; 6,-4.35 6,-3.65
Mechanical 11:
  lines w0.1: -5.75,9.1 5.75,9.1 ; -5.75,-5.45 -5.75,14.05 5.75,14.05 5.75,-5.45 -5.75,-5.45
Mechanical 15:
  lines w0.1: -0.5,0 0.5,0 ; 0,-0.5 0,0.5 ; -6.85,-6.55 -6.85,-4.25 -6.55,-3.95 -6.55,14.05 6.55,14.05 6.55,-3.95 6.85,-4.25 6.85,-6.55 -6.85,-6.55
3D body "RN4020.step": height 2.3, standoff -0.01, extent -5.803,-5.45 5.703,14.055

## RTL8188_MODULE [mm]
pads (6):
  rect 2x1.4 smd: 1(-6.15,4.8) 2(-6.15,2) 3(-6.15,-1.5) 4(-6.15,-4) 5(6.15,-4.8) 6(6.15,-2.8)
Top Overlay:
  circle w0.254: c-8.103,4.801 r0.458
  rectangle: -4.826,-6.883 4.826,6.02
  lines w0.2: -6.169,-0.482 -6.169,0.915 ; -6.169,2.947 -6.169,3.709 ; -6.15,-5.054 -6.15,-7 6.15,-7 ; -6.15,6.014 -6.15,6 6.15,6 ; 6.169,-6.959 6.169,-5.816 ; 6.169,-1.625 6.169,5.995
3D body: height 0.8, standoff 0, extent 4.928,-5.436 6.198,-4.166
3D body: height 0.8, standoff 0, extent 4.928,-3.429 6.198,-2.159
3D body: height 0.8, standoff 0, extent -6.248,-4.648 -4.978,-3.378
3D body: height 0.8, standoff 0, extent -6.223,-2.159 -4.953,-0.889
3D body: height 0.8, standoff 0, extent -6.223,1.397 -4.953,2.667
3D body: height 0.8, standoff 0, extent -6.223,4.191 -4.953,5.461
3D body: height 1.3, standoff 0, extent 2.975,0.534 5.515,4.09
3D body: height 1.3, standoff 0, extent -2.105,-2.895 2.34,4.09
3D body: height 0.8, standoff 0, extent -6.169,-6.959 6.15,5.995

## udaq-82LCC [mm]
pads (82):
  rrect100% 2.3x0.9 smd: 1(-15.5,12.69) 2(-15.5,11.42) 3(-15.5,10.15) 4(-15.5,8.88) 5(-15.5,7.61) 6(-15.5,6.34) 7(-15.5,5.07) 8(-15.5,3.8) 9(-15.5,2.53) 10(-15.5,1.26) 11(-15.5,-0.01) 12(-15.5,-1.28) 13(-15.5,-2.55) 14(-15.5,-3.82) 15(-15.5,-5.09) 16(-15.5,-6.36) 17(-15.5,-7.63) 18(-15.5,-8.9) 19(-15.5,-10.17) 20(-15.5,-11.44) 21(-15.5,-12.71) 42(15.5,-12.71) 43(15.5,-11.44) 44(15.5,-10.17) 45(15.5,-8.9) 46(15.5,-7.63) 47(15.5,-6.36) 48(15.5,-5.09) 49(15.5,-3.82) 50(15.5,-2.55) 51(15.5,-1.28) 52(15.5,-0.01) 53(15.5,1.26) 54(15.5,2.53) 55(15.5,3.8) 56(15.5,5.07) 57(15.5,6.34) 58(15.5,7.61) 59(15.5,8.88) 60(15.5,10.15) 61(15.5,11.42) 62(15.5,12.69)
  rrect100% 0.9x2.3 smd: 22(-12.065,-15.5) 23(-10.795,-15.5) 24(-9.525,-15.5) 25(-8.255,-15.5) 26(-6.985,-15.5) 27(-5.715,-15.5) 28(-4.445,-15.5) 29(-3.175,-15.5) 30(-1.905,-15.5) 31(-0.635,-15.5) 32(0.635,-15.5) 33(1.905,-15.5) 34(3.175,-15.5) 35(4.445,-15.5) 36(5.715,-15.5) 37(6.985,-15.5) 38(8.255,-15.5) 39(9.525,-15.5) 40(10.795,-15.5) 41(12.065,-15.5) 63(12.065,15.5) 64(10.795,15.5) 65(9.525,15.5) 66(8.255,15.5) 67(6.985,15.5) 68(5.715,15.5) 69(4.445,15.5) 70(3.175,15.5) 71(1.905,15.5) 72(0.635,15.5) 73(-0.635,15.5) 74(-1.905,15.5) 75(-3.175,15.5) 76(-4.445,15.5) 77(-5.715,15.5) 78(-6.985,15.5) 79(-8.255,15.5) 80(-9.525,15.5) 81(-10.795,15.5) 82(-12.065,15.5)
Top Layer keep-out:
  rectangle: -8.484,-8.354 2.235,-4.366
Top Overlay:
  circle w1: c-13.894,14.072 r0.105
  lines w0.2: -15.519,13.411 -15.519,13.843 -13.843,15.519 -12.751,15.519 ; -15.494,-13.462 -15.494,-15.519 -12.802,-15.519 ; 12.802,15.494 15.494,15.494 15.494,13.411 ; 12.852,-15.494 15.519,-15.494 15.519,-13.513
Mechanical 1:
  lines w0.1: -15.5,-15.5 -12.065,-15.5 15.5,-15.5 15.5,-12.71 15.5,12.69 15.5,15.5 12.065,15.5 -12.065,15.5 -13.862,15.5 -15.5,13.862 -15.5,12.69 -15.5,-12.71 -15.5,-15.5
  lines w0.254: -13.01,11.845 -11.786,13.07 ; -13.105,-13.115 13.105,-13.115 13.105,13.095 -13.105,13.095 -13.105,-13.115
3D body "uDAQ.step": height 5.87, standoff 0.01, extent -15.519,-15.481 15.481,15.519

## wizfi630a [mm]
pads (56):
  rect 0.6x2 smd: 1(-28.273,-46.531) 2(-27.867,-38.276) 3(-27.473,-46.531) 4(-27.067,-38.276) 5(-26.673,-46.531) 6(-26.267,-38.276) 7(-25.873,-46.531) 8(-25.467,-38.276) 9(-25.073,-46.531) 10(-24.667,-38.276) 11(-24.273,-46.531) 12(-23.867,-38.276) 13(-23.473,-46.531) 14(-23.067,-38.276) 15(-22.673,-46.531) 16(-22.267,-38.276) 17(-18.673,-46.531) 18(-18.267,-38.276) 19(-17.873,-46.531) 20(-17.467,-38.276) 21(-17.073,-46.531) 22(-16.667,-38.276) 23(-16.273,-46.531) 24(-15.867,-38.276) 25(-15.473,-46.531) 26(-15.067,-38.276) 27(-14.673,-46.531) 28(-14.267,-38.276) 29(-13.873,-46.531) 30(-13.467,-38.276) 31(-13.073,-46.531) 32(-12.667,-38.276) 33(-12.273,-46.531) 34(-11.867,-38.276) 35(-11.473,-46.531) 36(-11.067,-38.276) 37(-10.673,-46.531) 38(-10.267,-38.276) 39(-9.873,-46.531) 40(-9.467,-38.276) 41(-9.073,-46.531) 42(-8.667,-38.276) 43(-8.273,-46.531) 44(-7.867,-38.276) 45(-7.473,-46.531) 46(-7.067,-38.276) 47(-6.673,-46.531) 48(-6.267,-38.276) 49(-5.873,-46.531) 50(-5.467,-38.276) 51(-5.073,-46.531) 52(-4.667,-38.276)
  round 0 hole 2.5 unplated: 7(-28.6,-2.9) 7(-4.4,-2.9)
  rect 2.3x3.2 smd: S(-30.854,-46.277) S(-1.949,-46.277)
Top Overlay:
  lines w0.15: -31.369,-44.45 -31.369,-37.973 -28.829,-37.973 -28.829,-38.481 -28.448,-38.481 ; -31.369,-40.64 -1.524,-40.64 ; -29.464,-46.99 -28.829,-46.99 ; -22.098,-46.99 -19.177,-46.99 ; -4.572,-46.99 -3.302,-46.99 ; -4.064,-38.481 -4.064,-37.973 -1.524,-37.973 -1.524,-44.45 ; -28.829,-48.387 -27.813,-48.387 -28.321,-47.879 -28.829,-48.387
Mechanical 1:
  lines w0.15: -33,-1.04 -33,0 ; -29.3,-39.304 -29.3,-43 -21.05,-43 -21.05,-39.697 ; -29.3,-39.3 -33,-39.3 -33,0 ; -21.049,-39.697 cw(c-20.339,-39.697) -20.339,-38.987 -20.299,-38.987 cw(c-20.299,-39.737) -19.549,-39.737 ; -19.55,-39.737 -19.55,-43 -3.7,-43 -3.7,-39.304 ; -3.7,-39.3 0,-39.3 0,-39.1 0,0 ; 0.007,0 -33,0
Mechanical 2:
  drawing of 461 lines, arcs and shapes, not listed
Mechanical 16:
  lines w0.15: -31.369,-39.497 -33.02,-39.497 -33.02,0 0,0 0,-39.37 -1.524,-39.37
3D body: height 1.6, standoff 0.26, extent -30.894,-36.576 -2.634,-13.716
3D body: height 4.03, standoff 2.53, extent -25.364,-4.799 -22.376,-1.805
3D body: height 6.53, standoff 2.53, extent -30.8,-37.592 -2.54,-6.096
3D body: height 2.53, standoff 1.53, extent -33,-43 0,0
3D body "c-2041119-1-c-3d.stp": height 4.01, standoff -0.64, extent -31.417,-46.986 -1.517,-37.896

## WM-N-BM-14 [mm]
pads (75):
  rect 1.2x0.6 smd: 1(0.6,15.45) 2(0.6,14.45) 3(0.6,13.45) 4(0.6,12.45) 5(0.6,11.45) 6(0.6,10.45) 7(0.6,9.45) 8(0.6,8.45) 9(0.6,7.45) 10(0.6,6.45) 11(0.6,5.45) 12(0.6,4.45) 13(0.6,3.45) 14(0.6,2.45) 15(0.6,1.45) 33(19.4,1.45) 34(19.4,2.45) 35(19.4,3.45) 36(19.4,4.45) 37(19.4,5.45) 38(19.4,6.45) 39(19.4,7.45) 40(19.4,8.45) 41(19.4,9.45) 42(19.4,10.45) 43(19.4,11.45) 44(19.4,12.45) 45(19.4,13.45) 46(19.4,14.45) 47(19.4,15.45)
  rect 0.6x1.2 smd: 16(2,0.6) 17(3,0.6) 18(4,0.6) 19(5,0.6) 20(6,0.6) 21(7,0.6) 22(8,0.6) 23(9,0.6) 24(10,0.6) 25(11,0.6) 26(12,0.6) 27(13,0.6) 28(14,0.6) 29(15,0.6) 30(16,0.6) 31(17,0.6) 32(18,0.6) 48(18,16.3) 49(17,16.3) 50(16,16.3) 51(15,16.3) 52(14,16.3) 53(13,16.3) 54(12,16.3) 55(11,16.3) 56(10,16.3) 57(9,16.3) 58(8,16.3) 59(7,16.3) 60(6,16.3) 61(5,16.3) 62(4,16.3) 63(3,16.3) 64(2,16.3)
  rect 1.2x1.2 smd: 65(6.5,11.45) 66(6.5,8.45) 67(6.5,5.45) 68(10,11.45) 69(10,8.45) 70(10,5.45) 71(13.5,11.45) 72(13.5,8.45) 73(13.5,5.45) 74(19.12,27.07) 75(0.88,27.07)
Top Overlay:
  circle w0: c2,14.95 r0.316
  lines w0.127: 0,1 0,0 1,0 ; 0,27 0,28 1,28 ; 19,0 20,0 20,1 ; 19,28 20,28 20,27
Mechanical 8 keep-out:
  rectangle: 0,17.1 20,28
Mechanical 9 keep-out:
  rectangle: 0,17.1 20,28
Mechanical 14:
  lines w0: 9,13 11,13 ; 10,12 10,14
Mechanical 16:
  lines w0: 0,0 20,0 20,28 0,28 0,0
  text "1" at 0.381,15.24 h0.43
  text "15" at 0.254,1.143 h0.43
  text "16" at 2.286,0.127 h0.43
  text "32" at 18.288,0.254 h0.43
  text "33" at 19.939,1.651 h0.43
  text "47" at 19.812,15.748 h0.43
  text "48" at 17.78,16.764 h0.43
  text "64" at 1.778,16.891 h0.43
  text "65" at 6.096,11.176 h0.43
  text "66" at 6.096,8.255 h0.43
  text "67" at 6.096,5.207 h0.43
  text "68" at 9.652,11.176 h0.43
  text "69" at 9.652,8.255 h0.43
  text "70" at 9.652,5.207 h0.43
  text "71" at 13.081,11.176 h0.43
  text "72" at 13.081,8.255 h0.43
  text "73" at 13.081,5.207 h0.43
  text "74" at 18.796,26.797 h0.43
  text "75" at 0.508,26.797 h0.43
  text "PCB ANTENNA AREA" at 6.096,23.495 h0.43
  text "KEEP FREE OF COPPER" at 5.461,21.971 h0.43
3D body "P1 Complete.STEP": height 2.06, standoff 0.01, extent 0,0 20,28

## XCVR_RN2903-I/RM095 [mil]
pads (47):
  rect 60x40 smd: 1(350,-475) 2(350,-425) 3(350,-375) 4(350,-325) 5(350,-275) 6(350,-225) 7(350,-175) 8(350,-125) 9(350,-75) 10(350,-25) 11(350,25) 12(350,75) 13(350,125) 14(350,175) 15(350,225) 16(350,275) 17(350,325) 18(350,375) 19(350,425) 20(350,475) 28(-350,475) 29(-350,425) 30(-350,375) 31(-350,325) 32(-350,275) 33(-350,225) 34(-350,175) 35(-350,125) 36(-350,75) 37(-350,25) 38(-350,-25) 39(-350,-75) 40(-350,-125) 41(-350,-175) 42(-350,-225) 43(-350,-275) 44(-350,-325) 45(-350,-375) 46(-350,-425) 47(-350,-475)
  rect 40x60 smd: 21(150,525) 22(100,525) 23(50,525) 24(0,525) 25(-50,525) 26(-100,525) 27(-150,525)
Top Overlay:
  circle w0: c371.26,-524.21 r10
  lines w5: -350,-525 350,-525 ; -350,525 -200,525 ; 200,525 350,525
Mechanical 16:
  lines w5: -350,-525 -350,525 350,525 350,-525 -350,-525
Mechanical 27:
  lines w1.97: -393.7,-541.34 -393.7,570.87 393.7,570.87 393.7,-541.34 -393.7,-541.34
3D body "RN2903.step": height 131.5, standoff 0, extent -350,-525 350,525